# Altium footprint library PcbLib1.PcbLib: 56 footprints (part 3 of 4)
Each footprint in its own frame and in the unit in brackets; x right, y up, seen from the top. Pads: shape width x height; smd on the part's side, far side on the other; paste and mask are expansions set on the pad; w line width, h text height; cw(c..) or ccw(c..) is an arc to the next point about the centre after c.
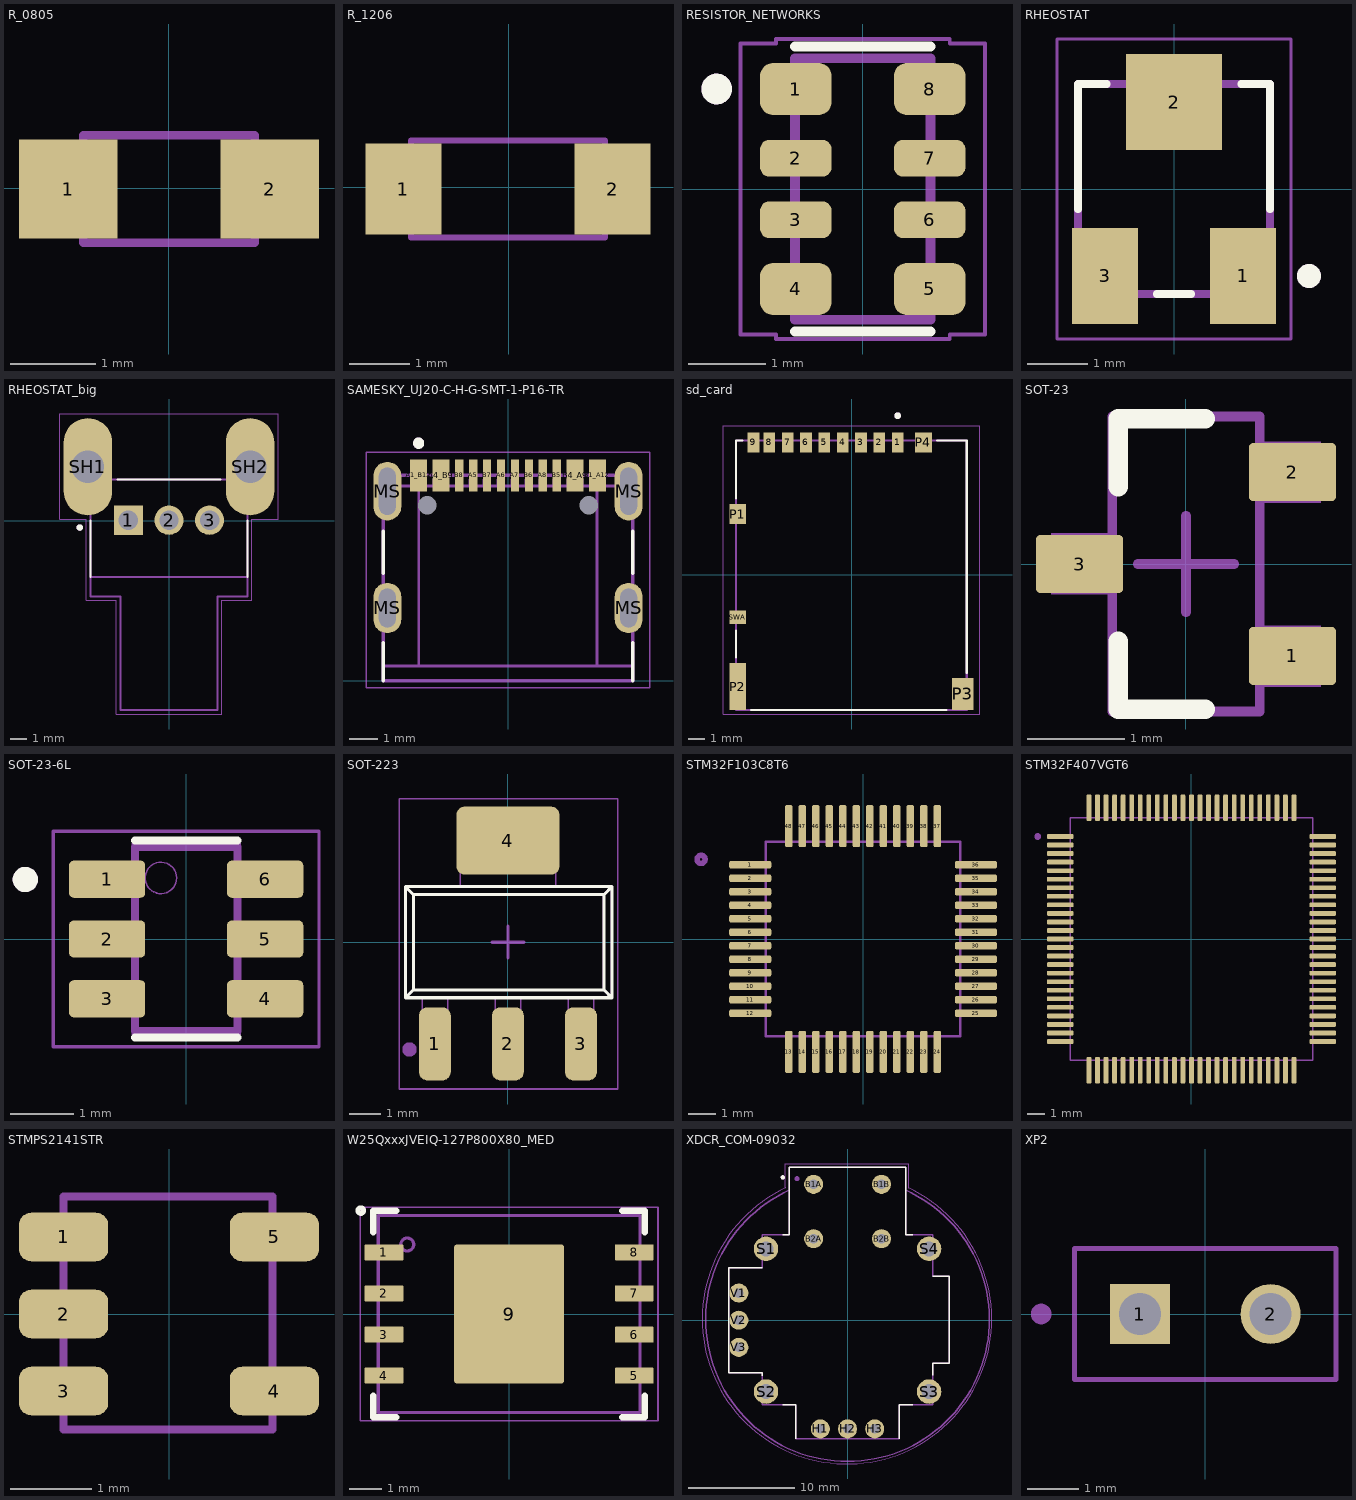
[diagram p2: the footprints below, top view; thin cyan lines are the x and y axes]

## R_0805 [mm]
pads (2):
  rect 1.15x1.15 smd: 1(-1.171,-0.008) 2(1.179,-0.008)
Top Assembly:
  lines w0.1: -0.996,-0.633 1.004,-0.633 1.004,0.617 -0.996,0.617 -0.996,-0.633
3D body "47k.STEP": height 0.6, standoff 0, extent -1,-0.65 1,0.6

## R_1206 [mm]
pads (2):
  rect 1.25x1.5 smd: 1(-1.74,-0.033) 2(1.71,-0.033)
Top Assembly:
  lines w0.1: -1.615,-0.833 1.585,-0.833 1.585,0.767 -1.615,0.767 -1.615,-0.833
3D body "1_5k.STEP": height 0.6, standoff 0, extent -1.6,-0.825 1.6,0.775

## RESISTOR_NETWORKS [mm]
pads (8):
  rrect50% 0.93x0.68 smd: 1(-0.87,1.3) 4(-0.87,-1.3) 5(0.87,-1.3) 8(0.87,1.3)
  rrect50% 0.93x0.48 smd: 2(-0.87,0.4) 3(-0.87,-0.4) 6(0.87,-0.4) 7(0.87,0.4)
Top Overlay:
  circle w0.2: c-1.9,1.3 r0.1
  lines w0.127: -0.88,-1.854 0.88,-1.854 ; -0.88,1.854 0.88,1.854
Top Assembly:
  lines w0.05: -1.59,-1.89 -1.13,-1.89 -1.13,-1.95 1.13,-1.95 1.13,-1.89 1.59,-1.89 1.59,1.89 1.13,1.89 1.13,1.95 -1.13,1.95 -1.13,1.89 -1.59,1.89 -1.59,-1.89
Top 3D Body:
  circle w0.2: c-1.9,1.3 r0.1
  lines w0.127: -0.88,-1.7 0.88,-1.7 0.88,1.7 -0.88,1.7 -0.88,-1.7
3D body "step_temp.STEP": height 0.6, standoff 0, extent -0.8,-1.6 0.8,1.6

## RHEOSTAT [mm]
pads (3):
  rect 1.1x1.6 smd: 1(1.15,-1.45) 3(-1.15,-1.45)
  rect 1.6x1.6 smd: 2(0,1.45)
Top Overlay:
  circle w0.2: c2.25,-1.45 r0.1
  lines w0.127: -1.6,-0.336 -1.6,1.75 -1.12,1.75 ; -0.286,-1.75 0.286,-1.75 ; 1.12,1.75 1.6,1.75 1.6,-0.336
Top Assembly:
  lines w0.05: -1.95,-2.5 1.95,-2.5 1.95,2.5 -1.95,2.5 -1.95,-2.5
Mechanical 13:
  circle w0.2: c2.25,-1.45 r0.1
  lines w0.127: -1.6,-1.75 1.6,-1.75 1.6,1.75 -1.6,1.75 -1.6,-1.75
3D body "step_temp.STEP": height 2.4, standoff 0, extent -1.6,-1.75 1.6,1.75

## RHEOSTAT_big [mm]
pads (5):
  rect 1.8x1.8 / inner round 1.8 / far side rect 1.8x1.8 hole 1.2: 1(-2.527,0.029)
  round 1.8 hole 1.2: 2(-0.027,0.029) 3(2.473,0.029)
  oval 3x6 hole 2 square: SH1(-5.027,3.329) SH2(4.973,3.329)
Top Overlay:
  circle w0.2: c-5.527,-0.421 r0.1
  lines w0.127: -4.877,-3.471 -4.877,0.009 ; -3.207,2.529 3.153,2.529 ; 4.823,-3.471 4.823,0.009
Top Assembly:
  lines w0.05: -6.777,0.079 -6.777,6.579 6.723,6.579 6.723,0.079 5.073,0.079 5.073,-4.921 3.223,-4.921 3.223,-11.921 -3.277,-11.921 -3.277,-4.921 -5.127,-4.921 -5.127,0.079 -6.777,0.079
Mechanical 13:
  circle w0.2: c-5.527,-0.421 r0.1
  lines w0.127: 4.799,-3.471 -4.877,-3.471 ; -4.877,-3.471 -4.877,5.729 -4.627,5.729 -4.627,2.529 4.573,2.529 4.573,5.729 4.823,5.729 4.823,-4.671 2.973,-4.671 2.973,-11.671 -3.027,-11.671 -3.027,-4.671 -4.877,-4.671 -4.877,-3.471
3D body "step_temp.STEP": height 15.5, standoff -3.8, extent -5.127,-14.971 5.073,2.429

## SAMESKY_UJ20-C-H-G-SMT-1-P16-TR [mm]
height 3.46
pads (18):
  rect 0.6x1.15 smd: A1_B12(-3.2,7.345) A4_B9(-2.4,7.345) B1_A12(3.2,7.345) B4_A9(2.4,7.345)
  rect 0.3x1.15 smd: A5(-1.25,7.345) A6(-0.25,7.345) A7(0.25,7.345) A8(1.25,7.345) B5(1.75,7.345) B6(0.75,7.345) B7(-0.75,7.345) B8(-1.75,7.345)
  oval 1x1.8 hole 0.6 slot 1.4 at 90 deg: MS(-4.32,2.6) MS(4.32,2.6)
  oval 1x2.1 hole 0.6 slot 1.7 at 90 deg: MS(-4.32,6.78) MS(4.32,6.78)
  round 0 hole 0.65 unplated: ""(-2.89,6.28) ""(2.89,6.28)
Top Overlay:
  circle w0.2: c-3.2,8.5 r0.1
  lines w0.127: -4.47,0 -4.47,1.35 ; -4.47,3.85 -4.47,5.35 ; 4.47,0 4.47,1.35 ; 4.47,3.85 4.47,5.35
Top Assembly:
  lines w0.1: -3.455,6.972 -3.455,7.202 -3.255,7.202 -3.255,6.972 ; -3.155,6.972 -3.155,7.202 -2.955,7.202 -2.955,6.972 ; -2.655,6.972 -2.655,7.202 -2.455,7.202 -2.455,6.972 ; -2.155,6.972 -2.155,7.202 -2.355,7.202 -2.355,6.972 ; -1.855,6.972 -1.855,7.202 -1.655,7.202 -1.655,6.972 ; -1.355,6.972 -1.355,7.202 -1.155,7.202 -1.155,6.972 ; -0.855,6.972 -0.855,7.202 -0.655,7.202 -0.655,6.972 ; -0.355,6.972 -0.355,7.202 -0.155,7.202 -0.155,6.972 ; 0.145,6.972 0.145,7.202 0.345,7.202 0.345,6.972 ; 0.645,6.972 0.645,7.202 0.845,7.202 0.845,6.972 ; 1.145,6.972 1.145,7.202 1.345,7.202 1.345,6.972 -1.014,6.972 -1.347,6.972 -2.355,6.972 ; 1.336,6.972 2.386,6.972 3.185,6.972 ; 1.645,6.972 1.645,7.202 1.845,7.202 1.845,6.972 ; 2.145,6.972 2.145,7.202 2.345,7.202 2.345,6.972 ; 2.445,6.972 2.445,7.202 2.645,7.202 2.645,6.972 ; 2.945,6.972 2.945,7.202 3.145,7.202 3.145,6.972 ; 3.245,6.972 3.245,7.202 3.445,7.202 3.445,6.972 ; -4.475,6.722 -4.475,0.522 -3.195,0.522 ; -4.475,6.722 -4.475,6.972 -4.024,6.972 ; -4.475,6.722 -4.264,6.722 -4.154,6.722 ccw(c-4.154,6.852) -4.024,6.852 -4.024,6.972 ; -4.024,6.972 -3.195,6.972 ; -3.195,0.522 -3.195,6.972 ; -3.195,0.522 3.185,0.522 ; -3.195,6.972 -2.355,6.972 ; 3.185,0.522 4.465,0.522 4.465,6.722 ; 3.185,0.522 3.185,6.972 ; 3.185,6.972 4.013,6.972 ; 4.013,6.972 4.465,6.972 4.465,6.722 ; 4.013,6.972 4.013,6.852 ccw(c4.143,6.852) 4.143,6.722 4.253,6.722 4.465,6.722
Top 3D Body:
  circle w0.2: c-3.2,8.5 r0.1
  lines w0.127: -4.47,0 4.47,0 4.47,7.35 -4.47,7.35 -4.47,0
Top Courtyard:
  lines w0.05: -5.07,-0.25 5.07,-0.25 5.07,8.17 -5.07,8.17 -5.07,-0.25
Multi-Layer:
  pour cut-out: -3.27,6.292 -3.27,6.364 -3.215,6.497 -3.113,6.598 -2.98,6.653 -2.909,6.653 -2.875,6.653 -2.804,6.653 -2.672,6.598 -2.571,6.498 -2.516,6.366 -2.516,6.294 -2.516,6.277 -2.516,6.204 -2.572,6.07 -2.675,5.967 -2.809,5.911 -2.882,5.911 -2.889,5.911 -2.965,5.911 -3.105,5.969 -3.212,6.076 -3.269,6.216 -3.269,6.291
  pour cut-out: 2.51,6.292 2.51,6.364 2.565,6.497 2.667,6.598 2.8,6.653 2.871,6.653 2.905,6.653 2.976,6.653 3.108,6.598 3.209,6.498 3.264,6.366 3.264,6.294 3.264,6.277 3.264,6.204 3.208,6.07 3.105,5.967 2.971,5.911 2.898,5.911 2.891,5.911 2.815,5.911 2.675,5.969 2.568,6.076 2.511,6.216 2.511,6.291
Top Designator:
  text ".Designator" at -1.367,9.161 h0.5
Top Value:
  text ".Comment" at -1.392,8.511 h0.5
3D body "step_temp.STEP": height 3.31, standoff -0.96, extent -4.47,0 4.47,7.6

## sd_card [mm]
pads (14):
  rect 0.7x1.2 smd paste+0 mask+0.102: 1(2.75,7.95) 2(1.65,7.95) 3(0.55,7.95) 4(-0.55,7.95) 5(-1.65,7.95) 6(-2.75,7.95) 7(-3.85,7.95) 8(-4.95,7.95) 9(-5.9,7.95)
  rect 1x1.2 smd paste+0 mask+0.102: P1(-6.85,3.65) P4(4.3,7.95)
  rect 1x2.8 smd paste+0 mask+0.102: P2(-6.85,-6.7)
  rect 1.3x1.9 smd paste+0 mask+0.102: P3(6.65,-7.15)
  rect 1x0.8 smd paste+0 mask+0.102: SWA(-6.85,-2.55)
Top Overlay:
  circle w0.2: c2.75,9.55 r0.1
  lines w0.127: -6.95,-4.95 -6.95,-3.35 ; -6.95,4.57 -6.95,8.05 -6.57,8.05 ; -6.03,-8.1 5.68,-8.1 ; 5.12,8.05 6.9,8.05 6.9,-5.88
Mechanical 13:
  circle w0.2: c2.75,9.55 r0.1
  lines w0.127: -6.95,-8.1 -6.95,8.05 6.9,8.05 6.9,-8.1 -6.95,-8.1
Mechanical 15:
  lines w0.05: 5.275,-8.35 -7.7,-8.35 -7.7,8.95 7.675,8.95 7.675,-8.35 5.3,-8.35
3D body "DM3AT-SF-PEJM5.STEP": height 1.68, standoff 0, extent -6.975,-8.1 6.875,8.05

## SOT-23 [mm]
pads (3):
  rrect15% 0.9x0.6 smd mask+0.05: 1(1.1,-0.95) 2(1.1,0.95) 3(-1.1,0)
Top Overlay:
  lines w0.2: -0.7,-0.8 -0.7,-1.5 0.2,-1.5 ; -0.7,0.8 -0.7,1.5 0.2,1.5
Top Assembly:
  region: 1.397,-0.635 0.762,-0.635 0.762,-1.27 1.397,-1.27
  region: 1.397,1.265 0.762,1.265 0.762,0.63 1.397,0.63
  rectangle: -1.397,-0.315 -0.762,0.32
  lines w0.1: -0.762,-1.524 -0.762,1.524 0.762,1.524 0.762,-1.524 -0.762,-1.524
Top Courtyard:
  lines w0.1: -0.5,0 0.5,0 ; 0,-0.5 0,0.5
3D body "SOT23.STEP": height 1.15, standoff 0, extent -1.275,-1.5 1.275,1.5

## SOT-23-6L [mm]
pads (6):
  rrect25% 1.21x0.59 smd: 1(-1.255,0.95) 2(-1.255,0) 3(-1.255,-0.95) 4(1.255,-0.95) 5(1.255,0) 6(1.255,0.95)
Top Overlay:
  circle w0.2: c-2.555,0.945 r0.1
  lines w0.127: -0.813,-1.565 0.813,-1.565 ; -0.813,1.565 0.813,1.565
Top Assembly:
  circle w0.025: c-0.401,0.97 r0.25
  lines w0.025: -1.14,-1.14 -1.14,-0.76 ; -1.14,-0.19 -1.14,0.19 ; -1.14,0.76 -1.14,1.14 ; -0.855,-1.14 -1.52,-1.14 -1.52,-0.76 -0.855,-0.76 ; -0.855,-0.19 -1.52,-0.19 -1.52,0.19 -0.855,0.19 ; -0.855,0.76 -1.52,0.76 -1.52,1.14 -0.855,1.14 ; 0.855,-1.14 1.52,-1.14 1.52,-0.76 0.855,-0.76 ; 0.855,-0.19 1.52,-0.19 1.52,0.19 0.855,0.19 ; 0.855,0.76 1.52,0.76 1.52,1.14 0.855,1.14 ; 1.14,-1.14 1.14,-0.76 ; 1.14,-0.19 1.14,0.19 ; 1.14,0.76 1.14,1.14 ; -0.855,-1.52 0.855,-1.52 0.855,1.52 -0.855,1.52 -0.855,-1.52
Top 3D Body:
  circle w0.2: c-2.555,0.945 r0.1
  lines w0.127: -0.813,-1.462 -0.813,1.462 0.813,1.462 0.813,-1.462 -0.813,-1.462
Top Courtyard:
  lines w0.05: -2.11,-1.713 2.11,-1.713 2.11,1.713 -2.11,1.713 -2.11,-1.713
Top Designator:
  text ".Designator" at -1.698,2.583 h0.5
Top Value:
  text ".Comment" at -1.723,1.933 h0.5
3D body "step_temp.STEP": height 1.44, standoff -0.01, extent -1.4,-1.462 1.4,1.462

## SOT-223 [mm]
height 1.8
pads (4):
  rrect50% 1x2.3 smd mask+0.05: 1(-2.3,-3.2) 2(0,-3.2) 3(2.3,-3.2)
  rrect25% 3.25x2.15 smd mask+0.05: 4(0,3.2)
Top Overlay:
  lines w0.1: -3.225,-1.75 -2.975,-1.5 ; -3.225,-1.75 -3.225,1.75 ; -3.225,-1.75 3.275,-1.75 ; -3.225,1.75 -2.975,1.5 ; -3.225,1.75 3.275,1.75 ; -2.975,-1.5 -2.975,1.5 ; -2.975,-1.5 3.025,-1.5 ; -2.975,1.5 3.025,1.5 ; 3.025,-1.5 3.025,1.5 ; 3.025,-1.5 3.275,-1.75 ; 3.025,1.5 3.275,1.75 ; 3.275,-1.75 3.275,1.75
Top Assembly:
  circle w0.254: c-3.099,-3.378 r0.1
  lines w0.05: -2.7,-3.05 -1.9,-3.05 ; -2.7,-2.3 -1.9,-2.3 ; -2.7,-1.75 -2.7,-3.55 -1.9,-3.55 -1.9,-1.75 ; -1.5,1.75 -1.5,3.55 1.5,3.55 1.5,1.75 ; -1.5,2.35 1.5,2.35 ; -1.5,3.1 1.5,3.1 ; -0.4,-3.05 0.4,-3.05 ; -0.4,-2.3 0.4,-2.3 ; -0.4,-1.75 -0.4,-3.55 0.4,-3.55 0.4,-1.75 ; 1.9,-3.05 2.7,-3.05 ; 1.9,-2.3 2.7,-2.3 ; 1.9,-1.75 1.9,-3.55 2.7,-3.55 2.7,-1.75 ; -3.25,-1.75 -3.25,1.75 ; -3.25,-1.75 -3,-1.5 ; -3.25,-1.75 3.25,-1.75 ; -3.25,1.75 -3,1.5 ; -3.25,1.75 3.25,1.75 ; -3,-1.5 -3,1.5 ; -3,-1.5 3,-1.5 ; -3,1.5 3,1.5 ; 3,-1.5 3,1.5 ; 3,-1.5 3.25,-1.75 ; 3,1.5 3.25,1.75 ; 3.25,-1.75 3.25,1.75
Top Courtyard:
  lines w0.05: -3.429,-4.623 3.454,-4.623 3.454,4.521 -3.429,4.521 -3.429,-4.623
  lines w0.1: -0.5,0 0.5,0 ; 0,-0.5 0,0.5
Top Designator:
  text ".Designator" at -1.676,5.537 h0.5
Top Value:
  text ".Comment" at -1.626,4.902 h0.5
3D body "SOT-223.STEP": height 1.68, standoff 0, extent -3.25,-3.48 3.25,3.48

## STM32F103C8T6 [mm]
pads (48):
  rrect50% 1.56x0.28 smd: 1(-4.18,2.75) 2(-4.18,2.25) 3(-4.18,1.75) 4(-4.18,1.25) 5(-4.18,0.75) 6(-4.18,0.25) 7(-4.18,-0.25) 8(-4.18,-0.75) 9(-4.18,-1.25) 10(-4.18,-1.75) 11(-4.18,-2.25) 12(-4.18,-2.75) 25(4.18,-2.75) 26(4.18,-2.25) 27(4.18,-1.75) 28(4.18,-1.25) 29(4.18,-0.75) 30(4.18,-0.25) 31(4.18,0.25) 32(4.18,0.75) 33(4.18,1.25) 34(4.18,1.75) 35(4.18,2.25) 36(4.18,2.75)
  rrect50% 0.28x1.56 smd: 13(-2.75,-4.18) 14(-2.25,-4.18) 15(-1.75,-4.18) 16(-1.25,-4.18) 17(-0.75,-4.18) 18(-0.25,-4.18) 19(0.25,-4.18) 20(0.75,-4.18) 21(1.25,-4.18) 22(1.75,-4.18) 23(2.25,-4.18) 24(2.75,-4.18) 37(2.75,4.18) 38(2.25,4.18) 39(1.75,4.18) 40(1.25,4.18) 41(0.75,4.18) 42(0.25,4.18) 43(-0.25,4.18) 44(-0.75,4.18) 45(-1.25,4.18) 46(-1.75,4.18) 47(-2.25,4.18) 48(-2.75,4.18)
Top Assembly:
  lines w0.1: -3.6,-3.6 -3.6,3.6 3.6,3.6 3.6,-3.6 -3.6,-3.6
Mechanical 13:
  circle w0.2: c-6,2.95 r0.15
3D body "step_temp.STEP": height 1.6, standoff 0, extent -4.5,-4.5 4.5,4.5

## STM32F407VGT6 [mm]
pads (100):
  rrect50% 1.56x0.28 smd: 1(-7.68,6) 2(-7.68,5.5) 3(-7.68,5) 4(-7.68,4.5) 5(-7.68,4) 6(-7.68,3.5) 7(-7.68,3) 8(-7.68,2.5) 9(-7.68,2) 10(-7.68,1.5) 11(-7.68,1) 12(-7.68,0.5) 13(-7.68,0) 14(-7.68,-0.5) 15(-7.68,-1) 16(-7.68,-1.5) 17(-7.68,-2) 18(-7.68,-2.5) 19(-7.68,-3) 20(-7.68,-3.5) 21(-7.68,-4) 22(-7.68,-4.5) 23(-7.68,-5) 24(-7.68,-5.5) 25(-7.68,-6) 51(7.68,-6) 52(7.68,-5.5) 53(7.68,-5) 54(7.68,-4.5) 55(7.68,-4) 56(7.68,-3.5) 57(7.68,-3) 58(7.68,-2.5) 59(7.68,-2) 60(7.68,-1.5) 61(7.68,-1) 62(7.68,-0.5) 63(7.68,0) 64(7.68,0.5) 65(7.68,1) 66(7.68,1.5) 67(7.68,2) 68(7.68,2.5) 69(7.68,3) 70(7.68,3.5) 71(7.68,4) 72(7.68,4.5) 73(7.68,5) 74(7.68,5.5) 75(7.68,6)
  rrect50% 0.28x1.56 smd: 26(-6,-7.68) 27(-5.5,-7.68) 28(-5,-7.68) 29(-4.5,-7.68) 30(-4,-7.68) 31(-3.5,-7.68) 32(-3,-7.68) 33(-2.5,-7.68) 34(-2,-7.68) 35(-1.5,-7.68) 36(-1,-7.68) 37(-0.5,-7.68) 38(0,-7.68) 39(0.5,-7.68) 40(1,-7.68) 41(1.5,-7.68) 42(2,-7.68) 43(2.5,-7.68) 44(3,-7.68) 45(3.5,-7.68) 46(4,-7.68) 47(4.5,-7.68) 48(5,-7.68) 49(5.5,-7.68) 50(6,-7.68) 76(6,7.68) 77(5.5,7.68) 78(5,7.68) 79(4.5,7.68) 80(4,7.68) 81(3.5,7.68) 82(3,7.68) 83(2.5,7.68) 84(2,7.68) 85(1.5,7.68) 86(1,7.68) 87(0.5,7.68) 88(0,7.68) 89(-0.5,7.68) 90(-1,7.68) 91(-1.5,7.68) 92(-2,7.68) 93(-2.5,7.68) 94(-3,7.68) 95(-3.5,7.68) 96(-4,7.68) 97(-4.5,7.68) 98(-5,7.68) 99(-5.5,7.68) 100(-6,7.68)
Top Assembly:
  lines w0.1: -7.1,-7.1 7.1,-7.1 7.1,7.1 -7.1,7.1 -7.1,-7.1
Mechanical 13:
  circle w0.2: c-9,6 r0.1
3D body "step_temp.STEP": height 1.6, standoff 0, extent -8,-8 8,8

## STMPS2141STR [mm]
pads (5):
  rrect50% 1.1x0.6 smd: 1(-1.3,0.95) 2(-1.3,0) 3(-1.3,-0.95) 4(1.3,-0.95) 5(1.3,0.95)
Top Assembly:
  lines w0.1: -1.3,-1.425 -1.3,1.45 1.275,1.45 1.275,-1.425 -1.3,-1.425
3D body "step_temp.STEP": height 1.45, standoff 0, extent -1.4,-1.45 1.4,1.45

## W25QxxxJVEIQ-127P800X80_MED [mm] "WSON, 8-Leads, Body 6,00x8,00mm, Pitch 1,27mm, Thermal Pad 4,30x3,40mm, IPC Medium Density"
height 0.8
pads (9):
  rrect15% 1.2x0.5 smd mask+0.05: 1(-3.87,1.905) 2(-3.87,0.635) 3(-3.87,-0.635) 4(-3.87,-1.905) 5(3.87,-1.905) 6(3.87,-0.635) 7(3.87,0.635) 8(3.87,1.905)
  rrect5% 3.4x4.3 smd paste-1.7 mask+0.05: 9(0,0)
Top Overlay:
  lines w0.15: -4.497,3.2 ccw(c-4.586,3.2) -4.497,3.2
  lines w0.2: -4.2,-2.53 -4.2,-3.2 -3.495,-3.2 ; -4.2,2.53 -4.2,3.2 -3.495,3.2 ; 3.495,-3.2 4.2,-3.2 4.2,-2.53 ; 3.495,3.2 4.2,3.2 4.2,2.53
Top Paste:
  rectangle: -1.595,0.815 -0.665,2.045
  rectangle: -1.595,-0.615 -0.665,0.615
  rectangle: -1.595,-2.045 -0.665,-0.815
  rectangle: -0.465,0.815 0.465,2.045
  rectangle: -0.465,-0.615 0.465,0.615
  rectangle: -0.465,-2.045 0.465,-0.815
  rectangle: 0.665,0.815 1.595,2.045
  rectangle: 0.665,-0.615 1.595,0.615
  rectangle: 0.665,-2.045 1.595,-0.815
Top Assembly:
  circle w0.1: c-3.15,2.15 r0.2
  lines w0.1: -4.05,-3.05 -4.05,3.05 4.05,3.05 4.05,-3.05 -4.05,-3.05
Top Courtyard:
  lines w0.05: -4.605,-3.3 -4.605,3.3 4.605,3.3 4.605,-3.3 -4.605,-3.3
  lines w0.1: -0.5,0 0.5,0 ; 0,-0.5 0,0.5
Top Designator:
  text ".Designator" at -1.626,4.166 h0.5
Top Value:
  text ".Comment" at -1.6,3.531 h0.5
3D body "W25QxxxJVEIQ-127P800X80_MED.step": height 0.8, standoff 0, extent -4.1,-3.05 4.1,3.05

## XDCR_COM-09032 [mil]
pads (14):
  round 70 hole 35.43: B1A(-125,500) B1B(125,500) B2A(-125,300) B2B(125,300)
  round 70 hole 35: H1(-100,-400) H2(0,-400) H3(100,-400) V1(-400,100) V2(-400,0) V3(-400,-100)
  round 90 hole 55: S1(-300,262.5) S2(-300,-262.5) S3(300,-262.5) S4(300,262.5)
Top Overlay:
  circle w7.87: c-238.19,525.59 r3.94
  lines w5: -312.99,-203.54 -312.99,-192.91 -437.01,-192.91 -437.01,192.91 -312.99,192.91 ; -238.98,-311.02 -190.94,-311.02 -190.94,-437.01 ; -238.98,314.96 -214.57,314.96 -214.57,562.99 214.57,562.99 214.57,314.96 239.37,314.96 ; 190.94,-437.01 190.94,-311.02 239.37,-311.02 ; 312.99,-201.57 312.99,-157.48 374.02,-157.48 374.02,161.42 312.99,161.42
Top Assembly:
  circle w10: c-186,521 r3.94
  lines w1.97: -228.35,486.22 -228.35,574.8 224.41,574.8 224.41,486.22 ; -227.17,486.77 ccw(c-1.97,3.83) 223.23,486.77
Top 3D Body:
  circle w7.87: c-238.19,525.59 r3.94
  lines w5: -212.33,479.35 ccw(c0,2.45) 212.33,479.35 ; -437.01,-192.91 -312.99,-192.91 -312.99,-311.02 -190.94,-311.02 -190.94,-437.01 190.94,-437.01 190.94,-311.02 312.99,-311.02 312.99,-157.48 374.02,-157.48 374.02,161.42 312.99,161.42 312.99,314.96 214.57,314.96 214.57,562.99 -214.57,562.99 -214.57,314.96 -312.99,314.96 -312.99,192.91 -437.01,192.91 -437.01,-192.91
3D body "COM-09032.STEP": height 1190, standoff -175, extent -527,-524.75 523,562.76

## XP2 [mil]
pads (2):
  rect 45.78x45.78 / inner round 45.78 / far side rect 45.78x45.78 hole 32: 1(-50,0)
  round 45.78 hole 32: 2(50,0)
Top Assembly:
  lines w3.94: -100,-50 100,-50 ; -100,-50 -100,50 ; -100,-50 -100,50 ; -100,50 100,50 ; -100,50 100,50 ; 100,-50 100,50 ; 100,-50 100,50
Mechanical 13:
  circle w7.87: c-125.59,0 r3.94
3D body "TS-102-T-A-1.stp": height 326, standoff -204, extent -103.99,-49.99 104.01,50.01